# Altium footprint library Switches.PcbLib: 117 footprints (part 4 of 8)
Each footprint in its own frame and in the unit in brackets; x right, y up, seen from the top. Pads: shape width x height; smd on the part's side, far side on the other; paste and mask are expansions set on the pad; w line width, h text height; cw(c..) or ccw(c..) is an arc to the next point about the centre after c.
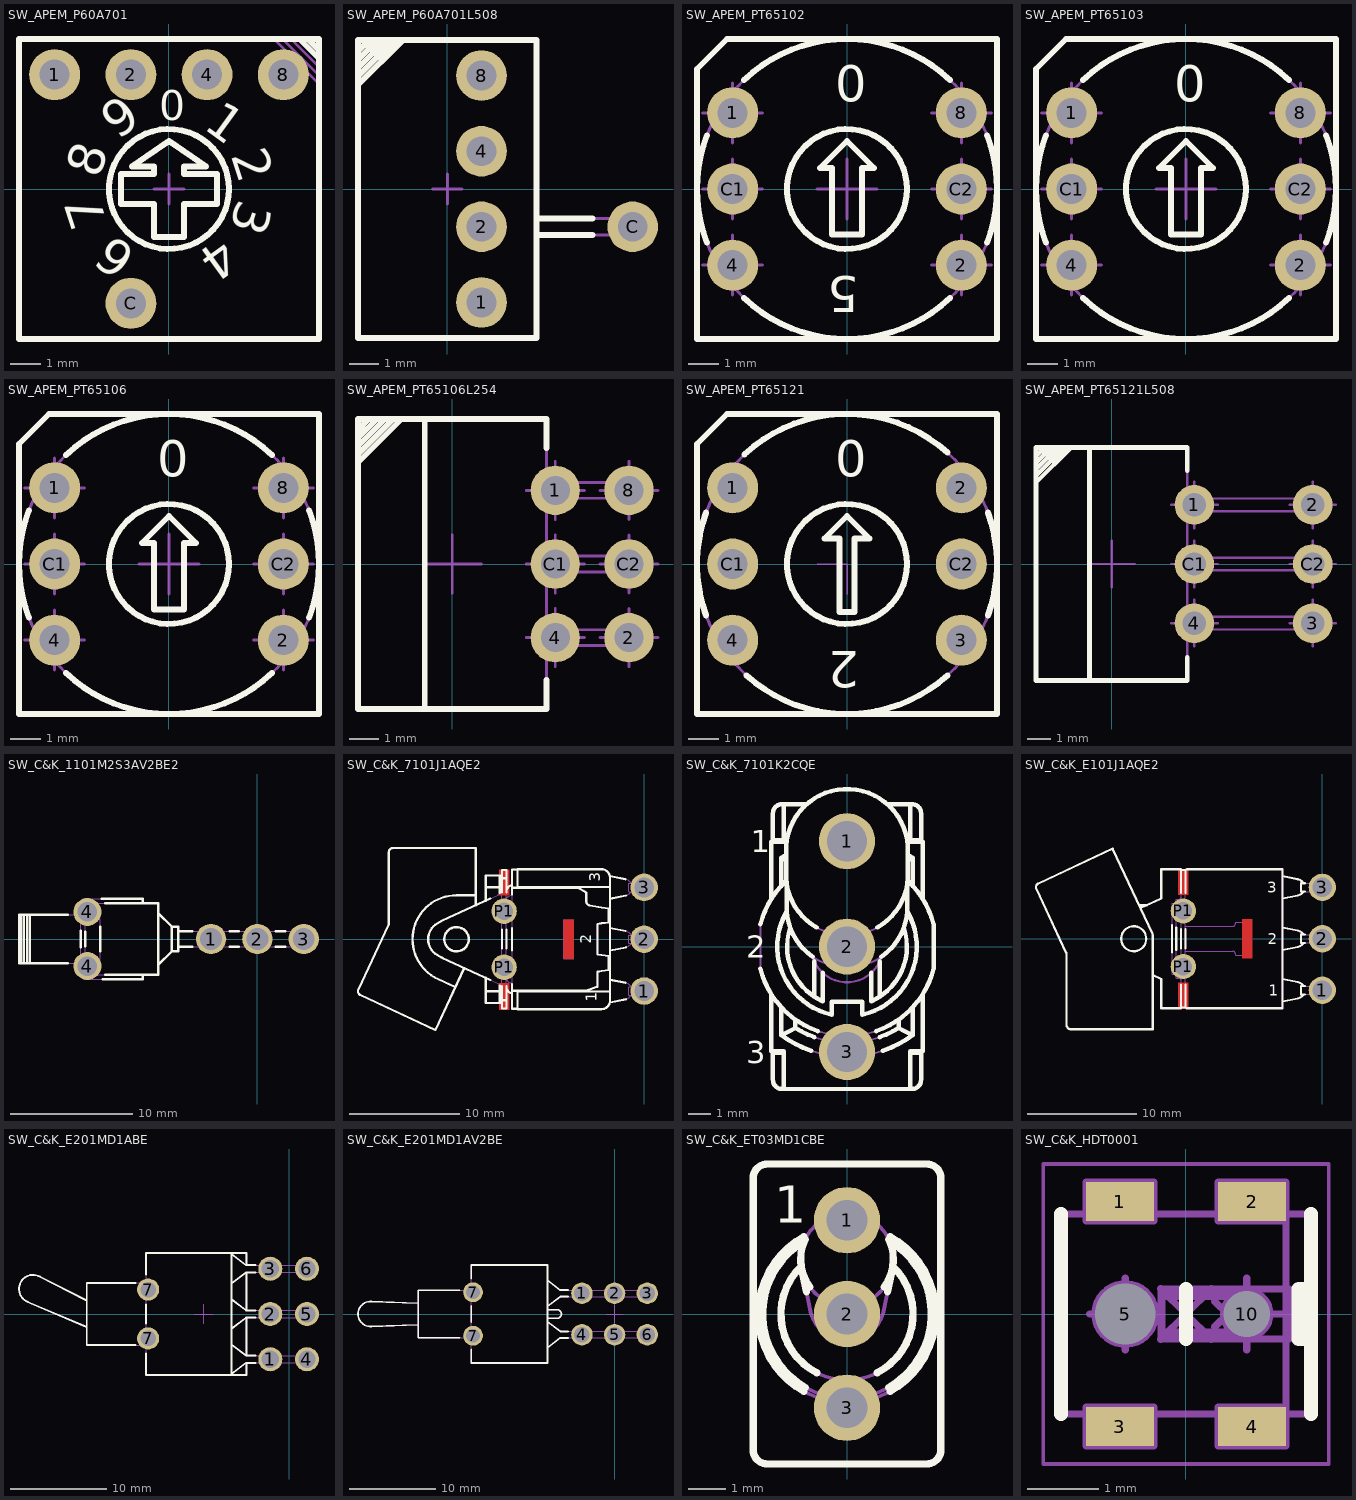
[diagram p3: the footprints below, top view; thin cyan lines are the x and y axes]

## SW_APEM_P60A701 [mm] "Body 10x10mm BCD Rotary Switches With Cross shaped slot, APEM P60A Series"
height 6
pads (5):
  round 1.7 hole 1: 1(-3.81,3.81) 2(-1.27,3.81) 4(1.27,3.81) 8(3.81,3.81) C(-1.27,-3.81)
Top Overlay:
  circle w0.2: c0,0 r2
  lines w0.2: 4.349,5 5,4.349 ; 4.631,5 5,4.631 ; 4.914,5 5,4.914 ; -5,-5 -5,5 5,5 5,-5 -5,-5 ; -1.6,-0.5 -1.6,0.5 -0.5,0.5 -0.5,0.75 -1.236,0.75 0,1.6 1.236,0.75 0.5,0.75 0.5,0.5 1.6,0.5 1.6,-0.5 0.5,-0.5 0.5,-1.6 -0.5,-1.6 -0.5,-0.5 -1.6,-0.5
  text "1" at 1.109,2.037 h1.2
  text "2" at 2.051,1.13 h1.2
  text "3" at 2.325,-0.288 h1.2
  text "4" at 1.74,-1.579 h1.2
  text "6" at -1.017,-2.104 h1.2
  text "7" at -2.058,-1.11 h1.2
  text "8" at -2.317,0.311 h1.2
  text "9" at -1.708,1.602 h1.2
  text "0" at -0.32,2.3 h1
Mechanical 8:
  lines w0.1: -4.31,3.81 -3.81,3.81 ; -3.81,3.31 -3.81,3.81 ; -3.81,4.31 -3.81,3.81 ; -3.31,3.81 -3.81,3.81 ; -1.77,-3.81 -1.27,-3.81 ; -1.77,3.81 -1.27,3.81 ; -1.27,-4.31 -1.27,-3.81 ; -1.27,-3.31 -1.27,-3.81 ; -1.27,3.31 -1.27,3.81 ; -1.27,4.31 -1.27,3.81 ; -0.77,-3.81 -1.27,-3.81 ; -0.77,3.81 -1.27,3.81 ; -0.5,0 0,0 ; 0,-0.5 0,0 ; 0,0.5 0,0 ; 0.5,0 0,0 ; 0.77,3.81 1.27,3.81 ; 1.27,3.31 1.27,3.81 ; 1.27,4.31 1.27,3.81 ; 1.77,3.81 1.27,3.81 ; 3.31,3.81 3.81,3.81 ; 3.81,3.31 3.81,3.81 ; 3.81,4.31 3.81,3.81 ; 4.31,3.81 3.81,3.81
Mechanical 14:
  circle w0.1: c0,0 r2
  lines w0.1: 3.5,5 5,3.5 ; 3.783,5 5,3.783 ; 4.066,5 5,4.066 ; 4.349,5 5,4.349 ; 4.631,5 5,4.631 ; 4.914,5 5,4.914 ; -5,-5 -5,5 5,5 5,-5 -5,-5 ; -1.6,-0.5 -1.6,0.5 -0.5,0.5 -0.5,0.75 -1.236,0.75 0,1.6 1.236,0.75 0.5,0.75 0.5,0.5 1.6,0.5 1.6,-0.5 0.5,-0.5 0.5,-1.6 -0.5,-1.6 -0.5,-0.5 -1.6,-0.5
  text "1" at 1.109,2.037 h1.2
  text "2" at 2.051,1.13 h1.2
  text "3" at 2.325,-0.288 h1.2
  text "4" at 1.74,-1.579 h1.2
  text "5" at 0.445,-2.3 h1.2
  text "6" at -1.017,-2.104 h1.2
  text "7" at -2.058,-1.11 h1.2
  text "8" at -2.317,0.311 h1.2
  text "9" at -1.708,1.602 h1.2
  text "0" at -0.4,2.3 h1.2
3D body "SW_APEM_P60A701.stp": height 6, standoff -3.5, extent -5,-5 5,5

## SW_APEM_P60A701L508 [mm] "Body 10x10mm Right Angled BCD Rotary Switches With Cross shaped slot, APEM P60A Series"
height 10
pads (5):
  round 1.7 hole 1: 1(1.15,-3.81) 2(1.15,-1.27) 4(1.15,1.27) 8(1.15,3.81) C(6.23,-1.27)
Top Overlay:
  lines w0.2: -3,3.5 -1.5,5 ; -3,3.783 -1.783,5 ; -3,4.066 -2.066,5 ; -3,4.349 -2.349,5 ; -3,4.631 -2.631,5 ; -3,4.914 -2.914,5 ; 3,-1.545 4.875,-1.545 ; 3,-0.995 4.875,-0.995 ; -3,-5 3,-5 3,5 -3,5 -3,-5
Mechanical 8:
  lines w0.1: -0.5,0 0,0 ; 0,-0.5 0,0 ; 0,0.5 0,0 ; 0.5,0 0,0 ; 0.65,-3.81 1.15,-3.81 ; 0.65,-1.27 1.15,-1.27 ; 0.65,1.27 1.15,1.27 ; 0.65,3.81 1.15,3.81 ; 1.15,-4.31 1.15,-3.81 ; 1.15,-3.31 1.15,-3.81 ; 1.15,-1.77 1.15,-1.27 ; 1.15,-0.77 1.15,-1.27 ; 1.15,0.77 1.15,1.27 ; 1.15,1.77 1.15,1.27 ; 1.15,3.31 1.15,3.81 ; 1.15,4.31 1.15,3.81 ; 1.65,-3.81 1.15,-3.81 ; 1.65,-1.27 1.15,-1.27 ; 1.65,1.27 1.15,1.27 ; 1.65,3.81 1.15,3.81 ; 5.73,-1.27 6.23,-1.27 ; 6.23,-1.77 6.23,-1.27 ; 6.23,-0.77 6.23,-1.27 ; 6.73,-1.27 6.23,-1.27
Mechanical 14:
  lines w0.1: -3,3.5 -1.5,5 ; -3,3.783 -1.783,5 ; -3,4.066 -2.066,5 ; -3,4.349 -2.349,5 ; -3,4.631 -2.631,5 ; -3,4.914 -2.914,5 ; 3,-1.545 6.38,-1.545 6.38,-0.995 3,-0.995 ; -3,-5 3,-5 3,5 -3,5 -3,-5
3D body "SW_APEM_P60A701L508.stp": height 10, standoff -3.5, extent -3,-5 6.38,5

## SW_APEM_PT65102 [mm] "Body 10x10mm, Straight Rotary BCD Complement Code Switch Whith Screwdriver Actuator, APEM PT65 (CR65) Series"
height 6.5
pads (6):
  round 1.7 hole 1: 1(-3.81,2.54) 2(3.81,-2.54) 4(-3.81,-2.54) 8(3.81,2.54) C1(-3.81,0) C2(3.81,0)
Top Overlay:
  circle w0.2: c0,0 r2
  lines w0.2: -4.673,-1.779 cw(c0,0) -4.673,1.779 ; -3.44,-3.629 ccw(c0,0) 3.44,-3.629 ; -3.44,3.629 cw(c0,0) 3.44,3.629 ; 4.673,-1.779 ccw(c0,0) 4.673,1.779 ; -5,-5 -5,4 -4,5 5,5 5,-5 -5,-5 ; -0.9,0.7 0,1.6 0.9,0.7 0.5,0.7 0.5,-1.52 -0.5,-1.52 -0.5,0.7 -0.9,0.7
  text "5" at 0.4,-2.9 h1.2
  text "0" at -0.4,2.9 h1.2
Mechanical 8:
  lines w0.1: -4.81,-2.54 -3.81,-2.54 ; -4.81,0 -3.81,0 ; -4.81,2.54 -3.81,2.54 ; -3.81,-3.54 -3.81,-2.54 ; -3.81,-1.54 -3.81,-2.54 ; -3.81,-1 -3.81,0 ; -3.81,1 -3.81,0 ; -3.81,1.54 -3.81,2.54 ; -3.81,3.54 -3.81,2.54 ; -2.81,-2.54 -3.81,-2.54 ; -2.81,0 -3.81,0 ; -2.81,2.54 -3.81,2.54 ; -1,0 0,0 ; 0,-1 0,0 ; 0,1 0,0 ; 1,0 0,0 ; 2.81,-2.54 3.81,-2.54 ; 2.81,0 3.81,0 ; 2.81,2.54 3.81,2.54 ; 3.81,-3.54 3.81,-2.54 ; 3.81,-1.54 3.81,-2.54 ; 3.81,-1 3.81,0 ; 3.81,1 3.81,0 ; 3.81,1.54 3.81,2.54 ; 3.81,3.54 3.81,2.54 ; 4.81,-2.54 3.81,-2.54 ; 4.81,0 3.81,0 ; 4.81,2.54 3.81,2.54
Mechanical 14:
  circle w0.1: c0,0 r2
  circle w0.1: c0,0 r5
  lines w0.1: -5,-5 -5,4 -4,5 5,5 5,-5 -5,-5 ; -0.9,0.7 0,1.6 0.9,0.7 0.5,0.7 0.5,-1.52 -0.5,-1.52 -0.5,0.7 -0.9,0.7
  text "1" at 1.381,2.581 h1.2
  text "2" at 2.634,1.277 h1.2
  text "3" at 2.882,-0.516 h1.2
  text "4" at 2.028,-2.111 h1.2
  text "5" at 0.4,-2.9 h1.2
  text "6" at -1.381,-2.581 h1.2
  text "7" at -2.634,-1.277 h1.2
  text "8" at -2.882,0.516 h1.2
  text "9" at -2.028,2.111 h1.2
  text "0" at -0.4,2.9 h1.2
3D body "SW_APEM_PT65102.stp": height 6.5, standoff -3.6, extent -5,-5 5,5

## SW_APEM_PT65103 [mm] "Body 10x10mm, Straight Rotary Hexadecimal Code Switch Whith Screwdriver Actuator, APEM PT65 (CR65) Series"
height 6.5
pads (6):
  round 1.7 hole 1: 1(-3.81,2.54) 2(3.81,-2.54) 4(-3.81,-2.54) 8(3.81,2.54) C1(-3.81,0) C2(3.81,0)
Top Overlay:
  circle w0.2: c0,0 r2
  lines w0.2: -4.673,-1.779 cw(c0,0) -4.673,1.779 ; -3.44,-3.629 ccw(c0,0) 3.44,-3.629 ; -3.44,3.629 cw(c0,0) 3.44,3.629 ; 4.673,-1.779 ccw(c0,0) 4.673,1.779 ; -5,-5 -5,4 -4,5 5,5 5,-5 -5,-5 ; -0.9,0.7 0,1.6 0.9,0.7 0.5,0.7 0.5,-1.52 -0.5,-1.52 -0.5,0.7 -0.9,0.7
  text "0" at -0.4,2.9 h1.2
Mechanical 8:
  lines w0.1: -4.81,-2.54 -3.81,-2.54 ; -4.81,0 -3.81,0 ; -4.81,2.54 -3.81,2.54 ; -3.81,-3.54 -3.81,-2.54 ; -3.81,-1.54 -3.81,-2.54 ; -3.81,-1 -3.81,0 ; -3.81,1 -3.81,0 ; -3.81,1.54 -3.81,2.54 ; -3.81,3.54 -3.81,2.54 ; -2.81,-2.54 -3.81,-2.54 ; -2.81,0 -3.81,0 ; -2.81,2.54 -3.81,2.54 ; -1,0 0,0 ; 0,-1 0,0 ; 0,1 0,0 ; 1,0 0,0 ; 2.81,-2.54 3.81,-2.54 ; 2.81,0 3.81,0 ; 2.81,2.54 3.81,2.54 ; 3.81,-3.54 3.81,-2.54 ; 3.81,-1.54 3.81,-2.54 ; 3.81,-1 3.81,0 ; 3.81,1 3.81,0 ; 3.81,1.54 3.81,2.54 ; 3.81,3.54 3.81,2.54 ; 4.81,-2.54 3.81,-2.54 ; 4.81,0 3.81,0 ; 4.81,2.54 3.81,2.54
Mechanical 14:
  circle w0.1: c0,0 r5
  circle w0.1: c0,0 r2
  lines w0.1: -5,-5 5,-5 5,5 -4,5 -5,4 -5,-5 ; -0.9,0.7 -0.5,0.7 -0.5,-1.52 0.5,-1.52 0.5,0.7 0.9,0.7 0,1.6 -0.9,0.7
  text "1" at 0.978,2.734 h1.2
  text "7" at 1.479,-2.526 h1.2
  text "8" at 0.4,-2.9 h1.2
  text "9" at -0.767,-2.821 h1.2
  text "F" at -1.453,2.537 h1.2
  text "E" at -2.313,1.788 h1.2
  text "D" at -2.832,0.74 h1.2
  text "C" at -2.9,-0.429 h1.2
  text "B" at -2.526,-1.479 h1.2
  text "A" at -1.727,-2.374 h1.2
  text "6" at 2.313,-1.788 h1.2
  text "5" at 2.832,-0.74 h1.2
  text "4" at 2.9,0.429 h1.2
  text "3" at 2.526,1.479 h1.2
  text "2" at 1.768,2.333 h1.2
  text "0" at -0.4,2.9 h1.2
3D body "SW_APEM_PT65103.stp": height 6.5, standoff -3.6, extent -5,-5 5,5

## SW_APEM_PT65106 [mm] "Body 10x10mm, Straight Rotary Hexadecimal Code Switch Whith Screwdriver Actuator, APEM PT65 (CR65) Series"
height 6.5
pads (6):
  round 1.7 hole 1: 1(-3.81,2.54) 2(3.81,-2.54) 4(-3.81,-2.54) 8(3.81,2.54) C1(-3.81,0) C2(3.81,0)
Top Overlay:
  circle w0.2: c0,0 r2
  lines w0.2: -4.673,-1.779 cw(c0,0) -4.673,1.779 ; -3.44,-3.629 ccw(c0,0) 3.44,-3.629 ; -3.44,3.629 cw(c0,0) 3.44,3.629 ; 4.673,-1.779 ccw(c0,0) 4.673,1.779 ; -5,-5 5,-5 5,5 -4,5 -5,4 -5,-5 ; -0.9,0.7 -0.5,0.7 -0.5,-1.52 0.5,-1.52 0.5,0.7 0.9,0.7 0,1.6 -0.9,0.7
  text "0" at -0.4,2.9 h1.2
Mechanical 8:
  lines w0.1: -4.81,-2.54 -3.81,-2.54 ; -4.81,0 -3.81,0 ; -4.81,2.54 -3.81,2.54 ; -3.81,-3.54 -3.81,-2.54 ; -3.81,-1.54 -3.81,-2.54 ; -3.81,-1 -3.81,0 ; -3.81,1 -3.81,0 ; -3.81,1.54 -3.81,2.54 ; -3.81,3.54 -3.81,2.54 ; -2.81,-2.54 -3.81,-2.54 ; -2.81,0 -3.81,0 ; -2.81,2.54 -3.81,2.54 ; -1,0 0,0 ; 0,-1 0,0 ; 0,1 0,0 ; 1,0 0,0 ; 2.81,-2.54 3.81,-2.54 ; 2.81,0 3.81,0 ; 2.81,2.54 3.81,2.54 ; 3.81,-3.54 3.81,-2.54 ; 3.81,-1.54 3.81,-2.54 ; 3.81,-1 3.81,0 ; 3.81,1 3.81,0 ; 3.81,1.54 3.81,2.54 ; 3.81,3.54 3.81,2.54 ; 4.81,-2.54 3.81,-2.54 ; 4.81,0 3.81,0 ; 4.81,2.54 3.81,2.54
Mechanical 14:
  circle w0.1: c0,0 r2
  circle w0.1: c0,0 r5
  lines w0.1: -5,-5 -5,4 -4,5 5,5 5,-5 -5,-5 ; -0.9,0.7 0,1.6 0.9,0.7 0.5,0.7 0.5,-1.52 -0.5,-1.52 -0.5,0.7 -0.9,0.7
  text "0" at -0.4,2.9 h1.2
  text "2" at 1.768,2.333 h1.2
  text "3" at 2.526,1.479 h1.2
  text "4" at 2.9,0.429 h1.2
  text "5" at 2.832,-0.74 h1.2
  text "6" at 2.313,-1.788 h1.2
  text "A" at -1.727,-2.374 h1.2
  text "B" at -2.526,-1.479 h1.2
  text "C" at -2.9,-0.429 h1.2
  text "D" at -2.832,0.74 h1.2
  text "E" at -2.313,1.788 h1.2
  text "F" at -1.453,2.537 h1.2
  text "9" at -0.767,-2.821 h1.2
  text "8" at 0.4,-2.9 h1.2
  text "7" at 1.479,-2.526 h1.2
  text "1" at 0.978,2.734 h1.2
3D body "SW_APEM_PT65106.stp": height 6.5, standoff -3.6, extent -5,-5 5,5

## SW_APEM_PT65106L254 [mm] "Body 10x10mm, Right Angled Rotary Hexadecimal Code Switch Whith Screwdriver Actuator, APEM PT65 (CR65) Series"
height 10
pads (6):
  round 1.7 hole 1: 1(3.55,2.54) 2(6.09,-2.54) 4(3.55,-2.54) 8(6.09,2.54) C1(3.55,0) C2(6.09,0)
Top Overlay:
  lines w0.2: -3.25,3.5 -1.75,5 ; -3.25,3.783 -2.033,5 ; -3.25,4.066 -2.316,5 ; -3.25,4.349 -2.598,5 ; -3.25,4.631 -2.881,5 ; -3.25,4.914 -3.164,5 ; -0.95,-5 -0.95,5 ; 3.25,-4 3.25,-5 -3.25,-5 -3.25,5 3.25,5 3.25,4
Mechanical 8:
  lines w0.1: -1,0 0,0 ; 0,-1 0,0 ; 0,1 0,0 ; 1,0 0,0 ; 2.55,-2.54 3.55,-2.54 ; 2.55,0 3.55,0 ; 2.55,2.54 3.55,2.54 ; 3.55,-3.54 3.55,-2.54 ; 3.55,-1.54 3.55,-2.54 ; 3.55,-1 3.55,0 ; 3.55,1 3.55,0 ; 3.55,1.54 3.55,2.54 ; 3.55,3.54 3.55,2.54 ; 4.55,-2.54 3.55,-2.54 ; 4.55,0 3.55,0 ; 4.55,2.54 3.55,2.54 ; 5.09,-2.54 6.09,-2.54 ; 5.09,0 6.09,0 ; 5.09,2.54 6.09,2.54 ; 6.09,-3.54 6.09,-2.54 ; 6.09,-1.54 6.09,-2.54 ; 6.09,-1 6.09,0 ; 6.09,1 6.09,0 ; 6.09,1.54 6.09,2.54 ; 6.09,3.54 6.09,2.54 ; 7.09,-2.54 6.09,-2.54 ; 7.09,0 6.09,0 ; 7.09,2.54 6.09,2.54
Mechanical 14:
  lines w0.1: -3.25,3.5 -1.75,5 ; -3.25,3.783 -2.033,5 ; -3.25,4.066 -2.316,5 ; -3.25,4.349 -2.598,5 ; -3.25,4.631 -2.881,5 ; -3.25,4.914 -3.164,5 ; -0.95,-5 -0.95,5 ; 3.25,-2.815 6.225,-2.815 6.225,-2.265 3.25,-2.265 ; 3.25,-0.275 6.225,-0.275 6.225,0.275 3.25,0.275 ; 3.25,2.265 6.225,2.265 6.225,2.815 3.25,2.815 ; -3.25,-5 3.25,-5 3.25,5 -3.25,5 -3.25,-5
3D body "SW_APEM_PT65106L254.stp": height 10, standoff -3.6, extent -3.25,-5 6.225,5

## SW_APEM_PT65121 [mm] "Body 10x10mm, Decimal Code 4 Positions Straight Rotary Switch Whith Arrow Shaped Slot Actuator, APEM PT65 (CR65) Series"
height 6.5
pads (6):
  round 1.7 hole 1: 1(-3.81,2.54) 2(3.81,2.54) 3(3.81,-2.54) 4(-3.81,-2.54) C1(-3.81,0) C2(3.81,0)
Top Overlay:
  circle w0.2: c0,0 r2
  lines w0.2: -4.698,-1.71 cw(c0,0) -4.698,1.71 ; -3.41,3.657 cw(c0,0) 3.346,3.716 ; -3.346,-3.716 ccw(c0,0) 3.346,-3.716 ; 4.698,-1.71 ccw(c0,0) 4.698,1.71 ; -5,-5 5,-5 5,5 -4,5 -5,4 -5,-5 ; -0.75,0.85 0,1.6 0.75,0.85 0.25,0.85 0.25,-1.6 -0.25,-1.6 -0.25,0.85 -0.75,0.85
  text "0" at -0.4,2.9 h1.2
  text "2" at 0.4,-2.9 h1.2
Mechanical 8:
  lines w0.05: -1,0 0,0 0,-1
  text "2" at 0.4,-2.9 h1.2
  text "3" at -2.9,-0.429 h1.2
  text "1" at 2.9,0.429 h1.2
Mechanical 14:
  circle w0.1: c0,0 r2
  circle w0.1: c0,0 r5
  lines w0.1: -5,-5 5,-5 5,5 -4,5 -5,4 -5,-5 ; -0.75,0.85 0,1.6 0.75,0.85 0.25,0.85 0.25,-1.6 -0.25,-1.6 -0.25,0.85 -0.75,0.85
  text "0" at -0.4,2.9 h1.2
3D body "SW_APEM_PT65121.stp": height 6.5, standoff -3.6, extent -5,-5 5,5

## SW_APEM_PT65121L508 [mm] "Body 10x10mm, Decimal Code 4 Positions Straight Rotary Switch Whith Arrow Shaped Slot Actuator 5.08mm P, PT65 (CR65) Series"
height 10
pads (6):
  round 1.7 hole 1: 1(3.55,2.54) 2(8.63,2.54) 3(8.63,-2.54) 4(3.55,-2.54) C1(3.55,0) C2(8.63,0)
Top Overlay:
  lines w0.2: -3.25,3.5 -1.75,5 ; -3.25,3.783 -2.033,5 ; -3.25,4.066 -2.316,5 ; -3.25,4.349 -2.598,5 ; -3.25,4.631 -2.881,5 ; -3.25,4.914 -3.164,5 ; -0.95,-5 -0.95,5 ; 3.25,-4 3.25,-5 -3.25,-5 -3.25,5 3.25,5 3.25,4
Mechanical 8:
  lines w0.1: -1,0 0,0 ; 0,-1 0,0 ; 0,1 0,0 ; 1,0 0,0 ; 2.55,-2.54 3.55,-2.54 ; 2.55,0 3.55,0 ; 2.55,2.54 3.55,2.54 ; 3.55,-3.54 3.55,-2.54 ; 3.55,-1.54 3.55,-2.54 ; 3.55,-1 3.55,0 ; 3.55,1 3.55,0 ; 3.55,1.54 3.55,2.54 ; 3.55,3.54 3.55,2.54 ; 4.55,-2.54 3.55,-2.54 ; 4.55,0 3.55,0 ; 4.55,2.54 3.55,2.54 ; 7.63,-2.54 8.63,-2.54 ; 7.63,0 8.63,0 ; 7.63,2.54 8.63,2.54 ; 8.63,-3.54 8.63,-2.54 ; 8.63,-1.54 8.63,-2.54 ; 8.63,-1 8.63,0 ; 8.63,1 8.63,0 ; 8.63,1.54 8.63,2.54 ; 8.63,3.54 8.63,2.54 ; 9.63,-2.54 8.63,-2.54 ; 9.63,0 8.63,0 ; 9.63,2.54 8.63,2.54
Mechanical 14:
  lines w0.1: -3.25,3.5 -1.75,5 ; -3.25,3.783 -2.033,5 ; -3.25,4.066 -2.316,5 ; -3.25,4.349 -2.598,5 ; -3.25,4.631 -2.881,5 ; -3.25,4.914 -3.164,5 ; -0.95,-5 -0.95,5 ; 3.25,-2.815 8.765,-2.815 8.765,-2.265 3.25,-2.265 ; 3.25,-0.275 8.765,-0.275 8.765,0.275 3.25,0.275 ; 3.25,2.265 8.765,2.265 8.765,2.815 3.25,2.815 ; -3.25,-5 -3.25,5 3.25,5 3.25,-5 -3.25,-5
3D body "SW_APEM_PT65121L508.stp": height 10, standoff -3.6, extent -3.25,-5 8.765,5

## SW_C&K_1101M2S3AV2BE2 [mm] "Vertical Right Angled PC Thru-Hole SPDT Slide Switch, .200\" High Actuator, C&K 1000 Series"
height 12.7
pads (5):
  round 2.5 hole 1.8: 1(-3.81,0) 2(0,0) 3(3.81,0)
  round 2.3 hole 1.6: 4(-13.97,-2.225) 4(-13.97,2.225)
Top Overlay:
  lines w0.2: -19.426,-2 -19.426,2 ; -19.214,-2 -19.214,2 ; -18.913,-2 -18.913,2 ; -18.682,-2 -18.682,2 ; -15.6,-2 -19.588,-2 -19.588,2 -15.6,2 ; -14.508,-0.7 -14.508,0.7 ; -14.152,-0.585 -14.152,0.585 ; -12.908,-1 -12.908,1 ; -12.8,3.302 -9.428,3.302 -9.428,2.946 ; -12.7,-3.302 -9.428,-3.302 -9.428,-2.946 ; -12.5,-2.946 -8.158,-2.946 -8.158,2.946 -12.5,2.946 ; -8.158,-2.134 -7.04,-1.016 ; -8.158,2.134 -7.04,1.016 ; -6.507,-0.635 -5.333,-0.635 ; -6.507,0.635 -5.333,0.635 ; -2.287,-0.635 -1.523,-0.635 ; -2.287,0.635 -1.523,0.635 ; 1.523,-0.635 2.287,-0.635 ; 1.523,0.635 2.287,0.635 ; -7.04,-1.016 -7.04,1.016 ; -7.04,-1.016 -6.507,-1.016 -6.507,1.016 -7.04,1.016
Mechanical 8:
  lines w0.1: -14.47,-2.225 -13.97,-2.225 ; -14.47,2.225 -13.97,2.225 ; -13.97,-2.725 -13.97,-2.225 ; -13.97,-1.725 -13.97,-2.225 ; -13.97,1.725 -13.97,2.225 ; -13.97,2.725 -13.97,2.225 ; -13.47,-2.225 -13.97,-2.225 ; -13.47,2.225 -13.97,2.225 ; -4.31,0 -3.81,0 ; -3.81,-0.5 -3.81,0 ; -3.81,0.5 -3.81,0 ; -3.31,0 -3.81,0 ; -0.5,0 0,0 ; 0,-0.5 0,0 ; 0,0.5 0,0 ; 0.5,0 0,0 ; 3.31,0 3.81,0 ; 3.81,-0.5 3.81,0 ; 3.81,0.5 3.81,0 ; 4.31,0 3.81,0
Mechanical 14:
  lines w0.1: -19.426,-2 -19.426,2 ; -19.214,-2 -19.214,2 ; -18.913,-2 -18.913,2 ; -18.682,-2 -18.682,2 ; -14.508,-2 -19.588,-2 -19.588,2 -14.508,2 ; -14.505,1.64 -12.908,1.64 -12.908,-1.64 -14.494,-1.64 ; -9.428,-2.946 -9.428,-3.302 -14.152,-3.302 cw(c-14.152,-2.946) -14.508,-2.946 -14.508,2.946 cw(c-14.152,2.946) -14.152,3.302 -9.428,3.302 -9.428,2.946 ; -8.158,-2.134 -7.04,-1.016 ; -8.158,2.134 -7.04,1.016 ; -6.507,-0.635 4.191,-0.635 4.191,0.635 -6.507,0.635 ; -7.04,-1.016 -7.04,1.016 ; -7.04,-1.016 -6.507,-1.016 -6.507,1.016 -7.04,1.016 ; -14.152,-2.946 -14.152,2.946 -8.158,2.946 -8.158,-2.946 -14.152,-2.946
3D body "SW_C&K_1101M2S3AV2BE2.stp": height 12.7, standoff -2.7, extent -19.588,-3.302 4.191,3.302

## SW_C&K_7101J1AQE2 [mm] "Right Angled PC Thru-Hole SPDT Rocker Switch, .531\" Long Horizontal Actuator, C&K 7000 Series"
height 9.27
pads (5):
  round 2.5 hole 1.8: 1(0,-4.7) 2(0,0) 3(0,4.7)
  round 2.3 hole 1.6: P1(-12.7,-2.54) P1(-12.7,2.54)
Top Layer:
  region: -13.153,-4 -13.153,-6.387 -12.247,-6.387 -12.247,-4
  region: -7.311,-1.774 -7.311,1.774 -6.405,1.774 -6.405,-1.774
  region: -13.145,6.286 -12.255,6.286 -12.255,4 -13.145,4
Top Overlay:
  drawing of 199 lines, arcs and shapes, not listed
  text "1" at -4.3,-5.69 h1
  text "2" at -4.8,-0.407 h1
  text "3" at -4,5.189 h1
Mechanical 8:
  lines w0.1: -13.2,-2.54 -12.7,-2.54 ; -13.2,2.54 -12.7,2.54 ; -12.7,-3.04 -12.7,-2.54 ; -12.7,-2.04 -12.7,-2.54 ; -12.7,2.04 -12.7,2.54 ; -12.7,3.04 -12.7,2.54 ; -12.2,-2.54 -12.7,-2.54 ; -12.2,2.54 -12.7,2.54 ; -0.5,-4.7 0,-4.7 ; -0.5,0 0,0 ; -0.5,4.7 0,4.7 ; 0,-5.2 0,-4.7 ; 0,-4.2 0,-4.7 ; 0,-0.5 0,0 ; 0,0.5 0,0 ; 0,4.2 0,4.7 ; 0,5.2 0,4.7 ; 0.5,-4.7 0,-4.7 ; 0.5,0 0,0 ; 0.5,4.7 0,4.7 ; -7.311,-1.774 -6.405,-1.774 -6.405,1.774 -7.311,1.774 -7.311,-1.774
  text "1" at -4.3,-5.69 h1
  text "2" at -4.8,-0.407 h1
  text "3" at -4,5.189 h1
Mechanical 14:
  drawing of 1029 lines, arcs and shapes, not listed
3D body "SW_C&K_7101J1AQE2.stp": height 9.78, standoff -3.3, extent -25.951,-8.227 0.635,8.268

## SW_C&K_7101K2CQE [mm] "SPDT Toggle Switch, Locking Lever .704\" High, Contact Rating 0.4VA 20V, 7000 Series"
height 34.5
pads (3):
  round 2.5 hole 1.8: 1(0,4.699) 2(0,0) 3(0,-4.699)
Top Overlay:
  lines w0.2: -3.861,-0.998 ccw(c0,0) -1.302,-3.769 ; -3.861,0.998 cw(c0,0) -2.706,2.93 ; -3.378,-2.119 -3.378,-4.674 -2.82,-4.674 -2.82,-6.35 ; -3.378,2.119 -3.378,4.674 -2.82,4.674 -2.82,6.35 ; -2.922,-2.714 -2.922,-3.953 ; -2.922,2.714 -2.922,3.953 ; -2.82,-4.737 -3.302,-4.737 -3.302,-5.944 ccw(c-2.896,-5.944) -2.896,-6.35 2.895,-6.35 ccw(c2.895,-5.944) 3.302,-5.944 3.302,-4.737 2.819,-4.737 ; -2.82,4.737 -3.302,4.737 -3.302,5.944 cw(c-2.896,5.944) -2.896,6.35 -1.795,6.35 ; -2.718,3.846 -2.922,3.953 ; -2.718,4.095 ccw(c0,-0.003) -2.922,3.953 ; -2.693,2.823 -2.693,1.857 ccw(c0,1.763) -1.535,-0.451 ; -2.687,1.569 ccw(c0,0) -0.673,-3.038 -0.673,-2.451 0.673,-2.451 0.673,-3.038 ccw(c0,0) 2.687,1.569 ; -2.533,0.845 ccw(c0,0.003) -1.08,-2.439 -1.08,-1.164 ; -2.299,-3.259 -2.299,-3.625 ; -1.599,-4.647 cw(c0,0.003) -2.922,-3.953 ; -1.461,-2.232 -1.461,-0.645 ; -1.457,-4.038 cw(c0,0) -2.299,-3.625 ; -1.355,0.851 cw(c0,3.209) -2.718,3.319 -2.718,4.196 cw(c0,4.306) 2.718,4.196 2.718,3.319 cw(c0,3.209) 1.355,0.851 ; 1.079,-1.164 1.079,-2.439 ccw(c0,0.003) 2.533,0.845 ; 1.302,-3.769 ccw(c0,0) 3.861,-0.998 3.861,0.998 ccw(c0,0) 2.705,2.93 ; 1.457,-4.038 ccw(c0,0) 2.299,-3.625 ; 1.46,-2.232 1.46,-0.645 ; 1.535,-0.451 ccw(c0,1.763) 2.692,1.857 2.692,2.823 ; 1.599,-4.647 ccw(c0,0.003) 2.921,-3.953 ; 1.794,6.35 2.895,6.35 cw(c2.895,5.944) 3.302,5.944 3.302,4.737 2.819,4.737 ; 2.299,-3.259 2.299,-3.625 ; 2.718,3.846 2.921,3.953 ; 2.718,4.095 cw(c0,-0.003) 2.921,3.953 ; 2.819,-6.35 2.819,-4.674 3.378,-4.674 3.378,-2.119 ; 2.819,6.35 2.819,4.674 3.378,4.674 3.378,2.119 ; 2.921,-2.714 2.921,-3.953 ; 2.921,2.714 2.921,3.953 ; -2.922,-3.953 -2.299,-3.625 ; 2.299,-3.625 2.921,-3.953
  text "1" at -4.3,4.2 h1
  text "2" at -4.5,-0.5 h1
  text "3" at -4.5,-5.2 h1
Mechanical 8:
  lines w0.05: -0.5,-4.699 0,-4.699 ; -0.5,0 0,0 ; -0.5,4.699 0,4.699 ; 0,-5.199 0,-4.699 ; 0,-4.199 0,-4.699 ; 0,-0.5 0,0 ; 0,0.5 0,0 ; 0,4.199 0,4.699 ; 0,5.199 0,4.699 ; 0.5,-4.699 0,-4.699 ; 0.5,0 0,0 ; 0.5,4.699 0,4.699
  text "1" at -4.3,4.2 h1
  text "2" at -4.5,-0.5 h1
  text "3" at -4.5,-5.2 h1
Mechanical 14:
  lines w0.1: -3.378,-2.119 -3.378,-4.674 -2.82,-4.674 -2.82,-6.35 ; -3.378,2.119 -3.378,4.674 -2.82,4.674 -2.82,6.35 ; -2.922,-2.714 -2.922,-3.953 ; -2.922,2.714 -2.922,3.953 ; -2.82,-4.737 -3.302,-4.737 -3.302,-5.944 ccw(c-2.896,-5.944) -2.896,-6.35 2.895,-6.35 ccw(c2.895,-5.944) 3.302,-5.944 3.302,-4.737 2.819,-4.737 ; -2.82,4.737 -3.302,4.737 -3.302,5.944 cw(c-2.896,5.944) -2.896,6.35 -1.795,6.35 ; -2.718,3.846 -2.922,3.953 ; -2.718,4.095 ccw(c0,-0.003) -2.922,3.953 ; -2.706,2.93 ccw(c0,0) -3.861,0.998 -3.861,-0.998 ccw(c0,0) 3.861,-0.998 3.861,0.998 ccw(c0,0) 2.705,2.93 ; -2.693,2.823 -2.693,1.857 ccw(c0,1.763) 2.692,1.857 2.692,2.823 ; -2.687,1.569 ccw(c0,0) -0.673,-3.038 -0.673,-2.451 0.673,-2.451 0.673,-3.038 ccw(c0,0) 2.687,1.569 ; -2.533,0.845 ccw(c0,0.003) -1.08,-2.439 -1.08,-1.164 ; -2.299,-3.259 -2.299,-3.625 ; -1.532,-0.453 ccw(c0,0.003) 1.531,-0.453 ; -1.461,-2.232 -1.461,-0.645 ; 1.079,-1.164 1.079,-2.439 ccw(c0,0.003) 2.533,0.845 ; 1.46,-2.232 1.46,-0.645 ; 1.794,6.35 2.895,6.35 cw(c2.895,5.944) 3.302,5.944 3.302,4.737 2.819,4.737 ; 2.299,-3.259 2.299,-3.625 ; 2.718,3.846 2.921,3.953 ; 2.718,4.095 cw(c0,-0.003) 2.921,3.953 ; 2.819,-6.35 2.819,-4.674 3.378,-4.674 3.378,-2.119 ; 2.819,6.35 2.819,4.674 3.378,4.674 3.378,2.119 ; 2.921,-2.714 2.921,-3.953 ; 2.921,2.714 2.921,3.953 ; -2.922,-3.953 ccw(c0,0.003) 2.921,-3.953 ; -2.922,-3.953 -2.299,-3.625 ; -2.299,-3.625 ccw(c0,0) 2.299,-3.625 ; 2.299,-3.625 2.921,-3.953 ; -2.718,3.319 ccw(c0,3.209) 2.718,3.319 2.718,4.196 ccw(c0,4.306) -2.718,4.196 -2.718,3.319
3D body "SW_C&K_7101K2CQE.stp": height 34.52, standoff -4.45, extent -3.861,-6.35 3.861,7.022

## SW_C&K_E101J1AQE2 [mm] "Right Angled PC Thru-Hole SPDT Rocker Switch, .531\" Long Horizontal Actuator, C&K E Series"
height 9.5
pads (5):
  round 2.5 hole 1.8: 1(0,-4.7) 2(0,0) 3(0,4.7)
  round 2.3 hole 1.6: P1(-12.7,-2.54) P1(-12.7,2.54)
Top Layer:
  region: -13.153,-4 -13.153,-6.387 -12.247,-6.387 -12.247,-4
  region: -7.319,-1.774 -7.319,1.774 -6.413,1.774 -6.413,-1.774
  region: -13.145,6.286 -12.255,6.286 -12.255,4 -13.145,4
Top Overlay:
  circle w0.2: c-17.229,0 r1.146
  lines w0.2: -16.741,3.061 -16.049,3.061 ; -16.617,2.796 -14.714,3.683 -14.714,6.35 -12.911,6.35 -12.911,4.177 ; -15.493,-3.32 -14.714,-3.683 -14.714,-6.35 -12.911,-6.35 -12.911,-4.178 ; -13.724,-1.24 -13.724,1.24 ; -13.343,-1.017 -13.343,1.017 ; -12.911,-6.287 -12.505,-6.287 -12.505,-4.178 ; -12.911,-0.903 -12.911,0.902 ; -12.911,6.286 -12.505,6.286 -12.505,4.177 ; -12.505,-6.198 ccw(c-12.352,-6.198) -12.352,-6.35 -3.64,-6.35 -3.64,6.35 -12.352,6.35 ccw(c-12.352,6.198) -12.505,6.198 ; -12.505,-0.903 -12.505,0.902 ; -3.64,-5.73 -2.245,-5.448 ccw(c-2.395,-4.701) -1.735,-5.082 ; -3.64,-3.672 -2.245,-3.954 cw(c-2.395,-4.701) -1.735,-4.32 ; -3.64,-1.03 -2.245,-0.748 ccw(c-2.395,-0.001) -1.735,-0.382 ; -3.64,1.028 -2.245,0.746 cw(c-2.395,-0.001) -1.735,0.38 ; -3.64,3.67 -2.245,3.952 ccw(c-2.395,4.699) -1.735,4.318 ; -3.64,5.728 -2.245,5.446 cw(c-2.395,4.699) -1.735,5.08 ; -1.613,-5.082 -1.953,-5.082 -1.953,-4.32 -1.613,-4.32 ; -1.613,-0.382 -1.953,-0.382 -1.953,0.38 -1.613,0.38 ; -1.613,4.318 -1.953,4.318 -1.953,5.08 -1.613,5.08 ; -26.125,4.554 cw(c-25.78,4.715) -25.941,5.06 -19.15,8.227 -15.529,0.461 cw(c-15.874,0.3) -15.493,0.3 -15.493,-8.267 -22.986,-8.268 cw(c-22.986,-7.887) -23.367,-7.887 -23.367,-1.445 ccw(c-23.748,-1.445) -23.403,-1.284 -26.125,4.554
  text "1" at -4.89,-5.2 h1
  text "2" at -5.007,-0.5 h1
  text "3" at -5.011,4.2 h1
Mechanical 8:
  circle w0.1: c-12.708,2.54 r0.925
  circle w0.1: c-12.708,-2.54 r0.925
  circle w0.1: c-0.008,4.7 r0.925
  circle w0.1: c-0.008,0 r0.925
  circle w0.1: c-0.008,-4.7 r0.925
  lines w0.1: -13.208,-2.54 -12.708,-2.54 -12.708,-2.04 ; -13.208,2.54 -12.708,2.54 -12.708,3.04 ; -12.505,-1.143 -8.187,-1.143 cw(c-8.187,-1.397) -7.933,-1.397 -7.933,-1.524 -6.663,-1.524 -6.663,1.524 -7.933,1.524 -7.933,1.397 cw(c-8.187,1.397) -8.187,1.143 -12.505,1.143 ; -7.069,-1.524 -7.069,1.524 ; -0.508,-4.7 -0.008,-4.7 -0.008,-4.2 ; -0.508,0 -0.008,0 -0.008,0.5 ; -0.508,4.7 -0.008,4.7 -0.008,5.2
  text "1" at -4.89,-5.2 h1
  text "2" at -5.007,-0.5 h1
  text "3" at -5.011,4.2 h1
Mechanical 14:
  circle w0.1: c-17.229,0 r1.146
  lines w0.1: -16.741,3.061 -16.049,3.061 ; -16.617,2.796 -14.714,3.683 -14.714,6.35 -12.911,6.35 -12.911,-6.35 -14.714,-6.35 -14.714,-3.683 -15.493,-3.32 ; -13.343,-3.239 -13.724,-3.239 -13.724,3.238 -13.343,3.238 ; -12.911,-6.287 -12.505,-6.287 -12.505,6.286 -12.911,6.286 ; -12.911,-3.775 ccw(c-13.065,-3.781) -13.063,-3.628 -13.343,-3.628 -13.343,3.628 -13.063,3.628 ccw(c-13.065,3.781) -12.911,3.775 ; -12.505,-6.198 ccw(c-12.352,-6.198) -12.352,-6.35 -3.64,-6.35 -3.64,6.35 -12.352,6.35 ccw(c-12.352,6.198) -12.505,6.198 ; -3.64,-5.73 -2.245,-5.448 ccw(c-2.395,-4.701) -1.735,-5.082 ; -3.64,-3.672 -2.245,-3.954 cw(c-2.395,-4.701) -1.735,-4.32 ; -3.64,-1.03 -2.245,-0.748 ccw(c-2.395,-0.001) -1.735,-0.382 ; -3.64,1.028 -2.245,0.746 cw(c-2.395,-0.001) -1.735,0.38 ; -3.64,3.67 -2.245,3.952 ccw(c-2.395,4.699) -1.735,4.318 ; -3.64,5.728 -2.245,5.446 cw(c-2.395,4.699) -1.735,5.08 ; -26.125,4.554 cw(c-25.78,4.715) -25.941,5.06 -19.15,8.227 -15.529,0.461 cw(c-15.874,0.3) -15.493,0.3 -15.493,-8.267 -22.986,-8.268 cw(c-22.986,-7.887) -23.367,-7.887 -23.367,-1.445 ccw(c-23.748,-1.445) -23.403,-1.284 -26.125,4.554 ; -1.953,-5.082 -1.953,-4.32 0.627,-4.32 0.627,-5.082 -1.953,-5.082 ; -1.953,-0.382 -1.953,0.38 0.627,0.38 0.627,-0.382 -1.953,-0.382 ; -1.953,4.318 -1.953,5.08 0.627,5.08 0.627,4.318 -1.953,4.318
3D body "SW_C&K_E101J1AQE2.stp": height 9.56, standoff -2.36, extent -26.159,-8.268 0.627,8.227

## SW_C&K_E201MD1ABE [mm] "DPDT Toggle Switch - Right Angled PCB Mounting, .300\" High Actuator, Unthreaded Bushing, C&K E Series"
height 11.43
pads (8):
  round 2.5 hole 1.8: 1(-1.982,-4.7) 2(-1.982,0) 3(-1.982,4.7) 4(1.828,-4.7) 5(1.828,0) 6(1.828,4.7)
  round 2.3 hole 1.6: 7(-14.682,-2.54) 7(-14.682,2.54)
Top Overlay:
  lines w0.2: -27.257,1.28 -21.057,-1.358 ; -27.166,1.241 cw(c-26.64,2.603) -25.934,3.881 ; -26.023,3.927 -21.057,1.402 ; -16,-3.24 -21.057,-3.24 -21.057,3.24 -16,3.24 ; -14.887,-4.1 -14.887,-6.35 -4.477,-6.35 -4.477,-5.08 ; -14.887,-1 -14.887,1 ; -14.887,4.1 -14.887,6.35 -4.477,6.35 -4.477,5.08 ; -5.997,-6.35 -5.997,6.35 ; -5.997,-6.2 -4.504,-5.08 -3.536,-5.08 ; -5.997,-3.2 -4.504,-4.32 -3.536,-4.32 ; -5.997,-1.5 -4.504,-0.38 -3.536,-0.38 ; -5.997,1.5 -4.504,0.38 -3.536,0.38 ; -5.997,3.2 -4.504,4.32 -3.536,4.32 ; -5.997,6.2 -4.504,5.08 -3.536,5.08 ; -4.477,-4.32 -4.477,-0.38 ; -4.477,0.38 -4.477,4.32
Mechanical 8:
  lines w0.1: -15.682,-2.54 -14.682,-2.54 ; -15.682,2.54 -14.682,2.54 ; -14.682,-3.54 -14.682,-2.54 ; -14.682,-1.54 -14.682,-2.54 ; -14.682,1.54 -14.682,2.54 ; -14.682,3.54 -14.682,2.54 ; -13.682,-2.54 -14.682,-2.54 ; -13.682,2.54 -14.682,2.54 ; -9.89,0 -8.89,0 ; -8.89,-1 -8.89,0 ; -8.89,1 -8.89,0 ; -7.89,0 -8.89,0 ; -2.982,-4.7 -1.982,-4.7 ; -2.982,0 -1.982,0 ; -2.982,4.7 -1.982,4.7 ; -1.982,-5.7 -1.982,-4.7 ; -1.982,-3.7 -1.982,-4.7 ; -1.982,-1 -1.982,0 ; -1.982,1 -1.982,0 ; -1.982,3.7 -1.982,4.7 ; -1.982,5.7 -1.982,4.7 ; -0.982,-4.7 -1.982,-4.7 ; -0.982,0 -1.982,0 ; -0.982,4.7 -1.982,4.7 ; 0.828,-4.7 1.828,-4.7 ; 0.828,0 1.828,0 ; 0.828,4.7 1.828,4.7 ; 1.828,-5.7 1.828,-4.7 ; 1.828,-3.7 1.828,-4.7 ; 1.828,-1 1.828,0 ; 1.828,1 1.828,0 ; 1.828,3.7 1.828,4.7 ; 1.828,5.7 1.828,4.7 ; 2.828,-4.7 1.828,-4.7 ; 2.828,0 1.828,0 ; 2.828,4.7 1.828,4.7
Mechanical 14:
  lines w0.1: -27.257,1.28 -21.057,-1.358 ; -27.166,1.241 cw(c-26.64,2.603) -25.934,3.881 ; -26.023,3.927 -21.057,1.402 ; -14.887,-3.24 -21.057,-3.24 -21.057,3.24 -14.887,3.24 ; -5.997,-6.35 -5.997,6.35 ; -5.997,-6.2 -4.504,-5.08 2.463,-5.08 2.463,-4.32 -4.504,-4.32 -5.997,-3.2 ; -5.997,-1.5 -4.504,-0.38 2.463,-0.38 2.463,0.38 -4.504,0.38 -5.997,1.5 ; -5.997,3.2 -4.504,4.32 2.463,4.32 2.463,5.08 -4.504,5.08 -5.997,6.2 ; -4.477,-5.08 -4.477,-6.35 -14.887,-6.35 -14.887,6.35 -4.477,6.35 -4.477,5.08 ; -4.477,-4.32 -4.477,-0.38 ; -4.477,0.38 -4.477,4.32
3D body "SW_C&K_E201MD1ABE.stp": height 11.43, standoff -2.88, extent -28.021,-6.35 2.532,6.35

## SW_C&K_E201MD1AV2BE [mm] "DPDT Toggle Switch - Vertical Right Angled PCB Mounting, .300\" High Actuator, Unthreaded Bushing, C&K E Series"
height 12.7
pads (8):
  round 2.5 hole 1.8: 1(-3.81,2.415) 2(0,2.415) 3(3.81,2.415) 4(-3.81,-2.415) 5(0,-2.415) 6(3.81,-2.415)
  round 2.3 hole 1.6: 7(-16.51,-2.54) 7(-16.51,2.54)
Top Overlay:
  lines w0.2: -28.468,-1.46 -22.885,-1.25 ; -28.468,1.46 -22.885,1.25 ; -28.358,-1.456 cw(c-28.468,0) -28.358,1.456 ; -18.092,-2.78 -22.885,-2.78 ; -18.092,2.78 -22.885,2.78 ; -16.715,-4.127 -16.715,-5.715 -7.825,-5.715 -7.825,5.715 -16.715,5.715 -16.715,4.127 ; -16.715,-0.953 -16.715,0.953 ; -7.825,-3.915 -6.332,-2.795 -5.416,-2.795 ; -7.825,-0.915 -6.332,-2.035 -5.416,-2.035 ; -7.825,-0.51 -6.715,-0.51 ccw(c-6.715,0) -6.715,0.51 -7.825,0.51 ; -7.825,0.915 -6.332,2.035 -5.416,2.035 ; -7.825,3.915 -6.332,2.795 -5.416,2.795 ; -22.885,-2.78 -22.885,2.78 ; -22.885,-2.78 -22.885,2.78
Mechanical 8:
  lines w0.1: -17.51,-2.54 -16.51,-2.54 ; -17.51,2.54 -16.51,2.54 ; -16.51,-3.54 -16.51,-2.54 ; -16.51,-1.54 -16.51,-2.54 ; -16.51,1.54 -16.51,2.54 ; -16.51,3.54 -16.51,2.54 ; -15.51,-2.54 -16.51,-2.54 ; -15.51,2.54 -16.51,2.54 ; -4.81,-2.415 -3.81,-2.415 ; -4.81,2.415 -3.81,2.415 ; -3.81,-3.415 -3.81,-2.415 ; -3.81,-1.415 -3.81,-2.415 ; -3.81,1.415 -3.81,2.415 ; -3.81,3.415 -3.81,2.415 ; -2.81,-2.415 -3.81,-2.415 ; -2.81,2.415 -3.81,2.415 ; -1,-2.415 0,-2.415 ; -1,0 0,0 ; -1,2.415 0,2.415 ; 0,-3.415 0,-2.415 ; 0,-1.415 0,-2.415 ; 0,-1 0,0 ; 0,1 0,0 ; 0,1.415 0,2.415 ; 0,3.415 0,2.415 ; 1,-2.415 0,-2.415 ; 1,0 0,0 ; 1,2.415 0,2.415 ; 2.81,-2.415 3.81,-2.415 ; 2.81,2.415 3.81,2.415 ; 3.81,-3.415 3.81,-2.415 ; 3.81,-1.415 3.81,-2.415 ; 3.81,1.415 3.81,2.415 ; 3.81,3.415 3.81,2.415 ; 4.81,-2.415 3.81,-2.415 ; 4.81,2.415 3.81,2.415
Mechanical 14:
  lines w0.1: -28.468,-1.46 -22.885,-1.25 ; -28.468,1.46 -22.885,1.25 ; -28.358,-1.456 cw(c-28.468,0) -28.358,1.456 ; -16.715,-2.78 -22.885,-2.78 ; -16.715,2.78 -22.885,2.78 ; -7.825,-3.915 -6.332,-2.795 4.445,-2.795 4.445,-2.035 -6.332,-2.035 -7.825,-0.915 ; -7.825,-0.51 -6.715,-0.51 ccw(c-6.715,0) -6.715,0.51 -7.825,0.51 ; -7.825,0.915 -6.332,2.035 4.445,2.035 4.445,2.795 -6.332,2.795 -7.825,3.915 ; -22.885,-2.78 -22.885,2.78 ; -22.885,-2.78 -22.885,2.78 ; -16.715,-5.715 -7.825,-5.715 -7.825,5.715 -16.715,5.715 -16.715,-5.715
3D body "SW_C&K_E201MD1AV2BE.stp": height 12.7, standoff -3.18, extent -29.926,-5.715 4.445,5.715

## SW_C&K_ET03MD1CBE [mm] "SPDT Toggle Switch, Contact Rating 0.4VA 20V, ET Series"
height 19.49
pads (3):
  round 1.8 hole 1.1: 1(0,2.54) 2(0,0) 3(0,-2.54)
Top Overlay:
  lines w0.2: -1.169,-2.097 cw(c0,0) -1.169,2.097 ; -1.157,1.972 ccw(c0,0) -1.123,-1.991 ; -1.136,2.018 ccw(c0,1.478) -1.013,0.733 ; -1.099,0.596 -1.243,1.289 ccw(c0,0) -0.817,-1.594 ; 0.817,-1.594 ccw(c0,0) 1.243,1.289 1.099,0.596 ; 1.013,0.733 ccw(c0,1.478) 1.136,2.018 ; 1.123,-1.991 ccw(c0,0) 1.157,1.972 ; 1.169,-2.097 ccw(c0,0) 1.169,2.097 ; -2.54,-3.683 ccw(c-2.159,-3.683) -2.159,-4.064 2.159,-4.064 ccw(c2.159,-3.683) 2.54,-3.683 2.54,3.683 ccw(c2.159,3.683) 2.159,4.064 -2.159,4.064 ccw(c-2.159,3.683) -2.54,3.683 -2.54,-3.683
  text "1" at -1.969,2.479 h1
Mechanical 8:
  lines w0.1: -0.25,-2.54 0.25,-2.54 ; -0.25,0 0.25,0 ; -0.25,2.54 0.25,2.54 ; 0,-2.79 0,-2.29 ; 0,-0.25 0,0.25 ; 0,2.29 0,2.79
Mechanical 14:
  circle w0.1: c0,1.478 r1.258
  lines w0.1: -1.157,1.972 ccw(c0,0) 1.157,1.972 ; -1.061,2.153 ccw(c0,0) 1.061,2.153 ; -2.54,-3.683 ccw(c-2.159,-3.683) -2.159,-4.064 2.159,-4.064 ccw(c2.159,-3.683) 2.54,-3.683 2.54,3.683 ccw(c2.159,3.683) 2.159,4.064 -2.159,4.064 ccw(c-2.159,3.683) -2.54,3.683 -2.54,-3.683 ; -1.243,1.289 ccw(c0,0) 1.243,1.289 0.974,0 cw(c0,0.308) -0.974,0 -1.243,1.289
  text "1" at -1.969,2.479 h1
  text "3" at -1.949,-3.562 h1
3D body "SW_C&K_ET03MD1CBE.stp": height 19.31, standoff -3.3, extent -2.54,-4.064 2.553,4.064

## SW_C&K_HDT0001 [mm] "Micro Mini Surface Mount Detect Switches, HDT Serie"
height 3.35
pads (6):
  rect 0.95x0.55 smd: 1(-0.925,1.575) 2(0.925,1.575) 3(-0.925,-1.575) 4(0.925,-1.575)
  round 0.5 hole 0.85 unplated mask+0.175: 5(-0.85,0)
  round 0.5 hole 0.65 unplated mask+0.075: 10(0.85,0)
Top Overlay:
  lines w0.2: -1.75,-1.4 -1.75,1.4 ; 0,-0.35 0,0.35 ; 1.651,-0.35 1.577,-0.35 1.577,0.35 1.651,0.35 ; 1.75,-1.4 1.75,1.4
Mechanical 8:
  circle w0.1: c0.85,0 r0.325
  circle w0.1: c-0.85,0 r0.425
  lines w0.1: -1.35,0 -0.85,0 ; -0.85,-0.5 -0.85,0 ; -0.85,0.5 -0.85,0 ; -0.354,-0.354 0,0 ; -0.354,0.354 0,0 ; 0.354,-0.354 0,0 ; 0.354,0.354 0,0 ; 0.403,-0.178 0.58,-0.001 ; 0.403,0.176 0.58,-0.001 ; 0.579,0 0.58,-0.001 ; 0.756,-0.178 0.58,-0.001 ; 0.756,0.176 0.58,-0.001 ; 0.85,-0.5 0.85,0 ; 0.85,0.5 0.85,0 ; 1.35,0 0.85,0 ; -1.4,-1.3 -0.45,-1.3 ; -1.4,-1.3 -1.4,-1.85 -0.45,-1.85 -0.45,-1.3 ; -1.4,-1.3 -0.925,-1.575 -0.45,-1.3 ; -1.4,1.85 -0.45,1.85 ; -1.4,1.85 -1.4,1.3 -0.45,1.3 -0.45,1.85 ; -1.4,1.85 -0.925,1.575 -0.45,1.85 ; 0.45,-1.3 1.4,-1.3 ; 0.45,-1.3 0.45,-1.85 1.4,-1.85 ; 0.45,-1.3 0.925,-1.575 1.4,-1.3 ; 0.45,1.85 1.4,1.85 ; 0.45,1.85 0.45,1.3 1.4,1.3 1.4,1.85 ; 0.45,1.85 0.925,1.575 1.4,1.85 ; 1.4,-1.85 1.4,1.85 ; 1.4,-1.85 1.4,-1.3
Mechanical 14:
  lines w0.1: -1.75,-1.4 1.75,-1.4 1.75,1.4 -1.75,1.4 -1.75,-1.4 ; -0.35,-0.35 1.45,-0.35 1.45,0.35 -0.35,0.35 -0.35,-0.35 ; -0.34,-0.251 1.019,-0.251 1.019,0.249 -0.34,0.249 -0.34,-0.251
Mechanical 15:
  lines w0.05: -2,-2.1 -2,2.1 2,2.1 2,-2.1 -2,-2.1
3D body "SW_C&K_HDT0001.stp": height 3.35, standoff -0.5, extent -1.75,-1.65 1.75,1.65